# Altium footprint library Napelem_Inverter.PcbLib: 127 footprints (part 1 of 8)
Each footprint in its own frame and in the unit in brackets; x right, y up, seen from the top. Pads: shape width x height; smd on the part's side, far side on the other; paste and mask are expansions set on the pad; w line width, h text height; cw(c..) or ccw(c..) is an arc to the next point about the centre after c.
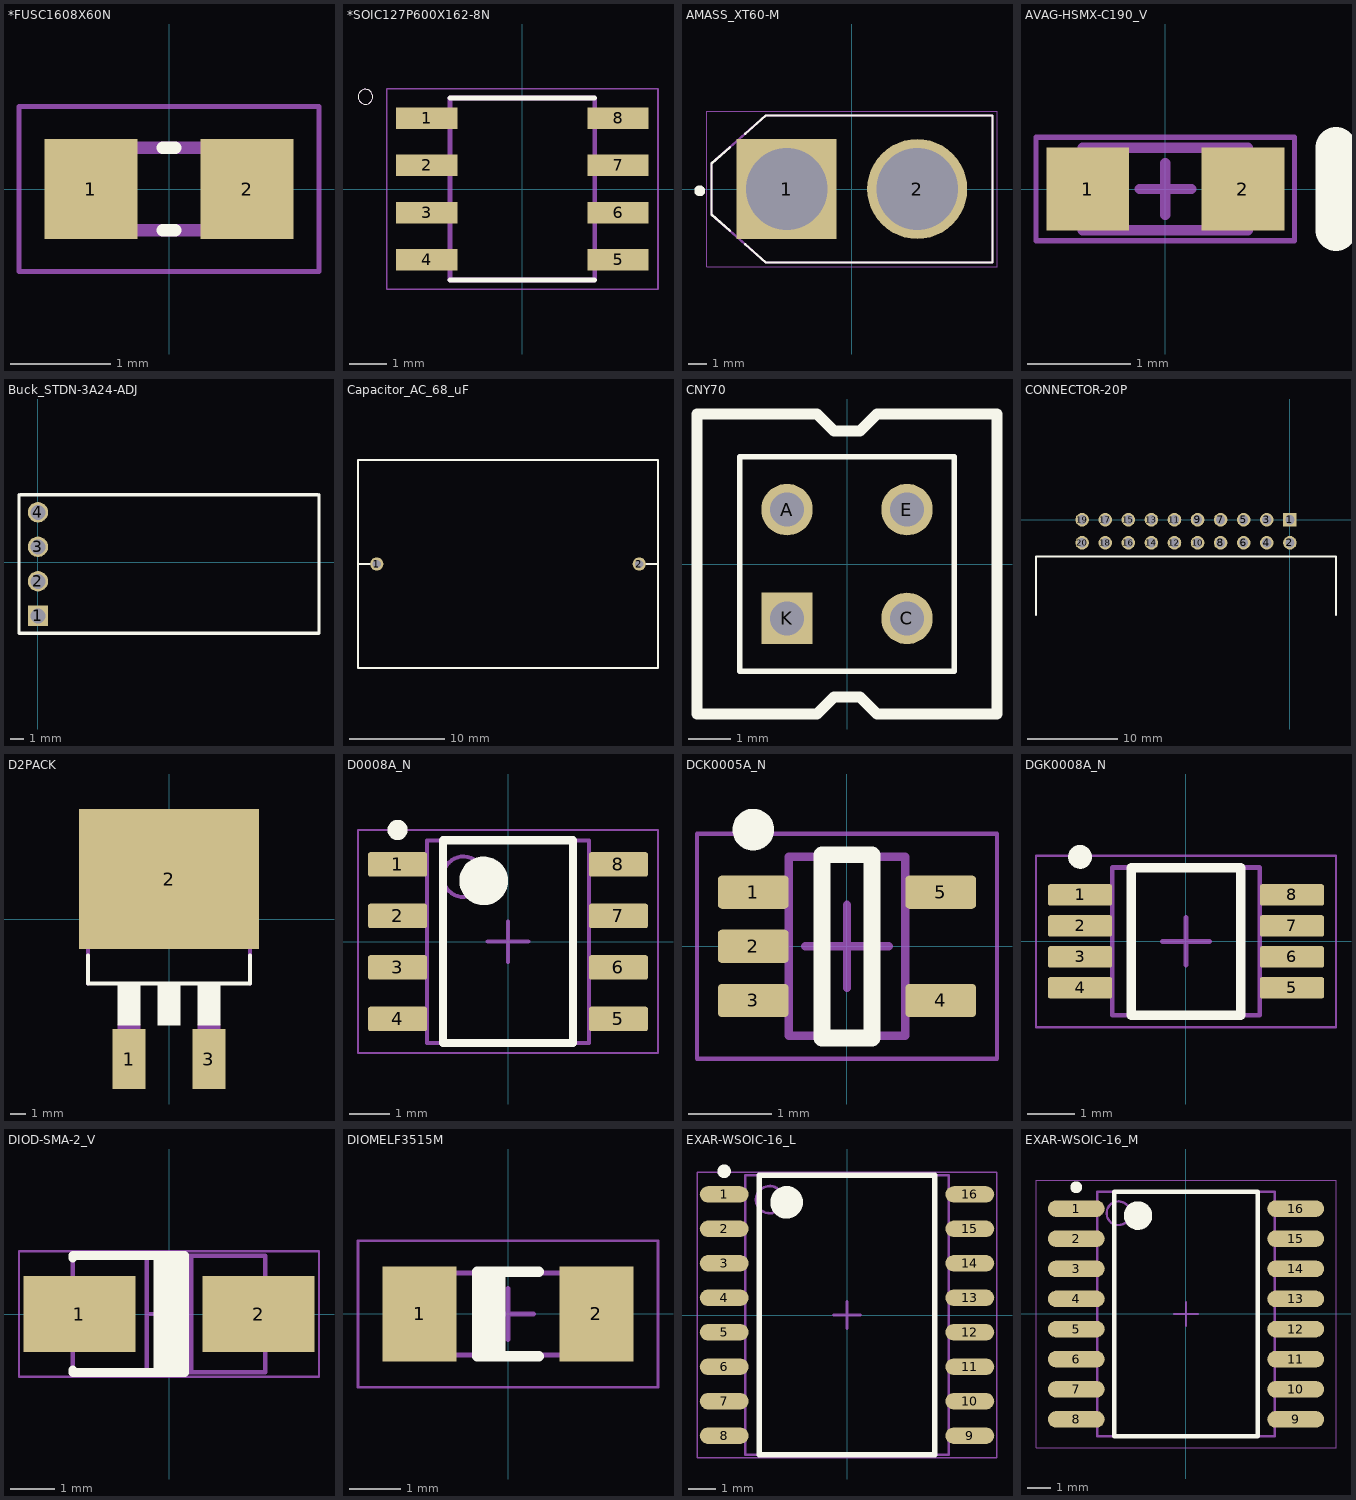
[diagram p0: the footprints below, top view; thin cyan lines are the x and y axes]

## *FUSC1608X60N [mm]
pads (2):
  rect 0.92x0.99 smd: 1(-0.775,0) 2(0.775,0)
Top Overlay:
  lines w0.127: -0.06,-0.41 0.06,-0.41 ; -0.06,0.41 0.06,0.41
Mechanical 4:
  lines w0.127: -0.8,-0.41 0.8,-0.41 ; -0.8,-0.41 -0.8,0.41 ; -0.8,-0.41 0.8,-0.41 ; -0.8,-0.41 -0.8,0.41 ; -0.8,0.41 0.8,0.41 ; -0.8,0.41 0.8,0.41 ; 0.8,-0.41 0.8,0.41 ; 0.8,-0.41 0.8,0.41
Mechanical 15:
  lines w0.05: -1.49,-0.82 -1.49,0.82 1.49,0.82 1.49,-0.82 -1.49,-0.82

## *SOIC127P600X162-8N [mm]
pads (8):
  rect 1.65x0.58 smd: 1(-2.58,1.905) 2(-2.58,0.635) 3(-2.58,-0.635) 4(-2.58,-1.905) 5(2.58,-1.905) 6(2.58,-0.635) 7(2.58,0.635) 8(2.58,1.905)
Top Overlay:
  circle w0: c-4.23,2.485 r0.2
  lines w0.127: -1.95,-2.45 1.95,-2.45 ; -1.95,2.45 1.95,2.45
Mechanical 4:
  circle w0: c-4.23,2.485 r0.2
  circle w0: c-4.23,2.485 r0.2
  lines w0.127: -1.95,-2.45 1.95,-2.45 ; -1.95,-2.45 -1.95,2.45 ; -1.95,-2.45 1.95,-2.45 ; -1.95,-2.45 -1.95,2.45 ; -1.95,2.45 1.95,2.45 ; -1.95,2.45 1.95,2.45 ; 1.95,-2.45 1.95,2.45 ; 1.95,-2.45 1.95,2.45
Mechanical 16:
  lines w0.05: -3.655,-2.7 3.655,-2.7 3.655,2.7 -3.655,2.7 -3.655,-2.7

## AMASS_XT60-M [mm]
pads (2):
  rect 5.516x5.516 hole 4.5: 1(-3.6,0)
  round 5.516 hole 4.5: 2(3.6,0)
Top Overlay:
  circle w0.3: c-8.4,-0.1 r0.15
  lines w0.127: -6.73,-2.3 -7.75,-1.4 -7.75,1.4 -6.73,2.3 ; -5.88,-3.05 -4.75,-4.05 7.75,-4.05 7.75,4.05 -4.75,4.05 -5.88,3.05
Mechanical 13:
  lines w0.127: -7.75,-1.4 -4.75,-4.05 7.75,-4.05 7.75,4.05 -4.75,4.05 -7.75,1.4 -7.75,-1.4
Mechanical 15:
  lines w0.05: -8,-4.3 8,-4.3 8,4.3 -8,4.3 -8,-4.3

## AVAG-HSMX-C190_V [mm] "SMD, 2-Leads, Body 1.6x0.8mm, Height 0.9mm"
height 0.9
pads (2):
  rect 0.8x0.8 smd: 1(-0.75,0) 2(0.75,0)
Top Overlay:
  lines w0.4: 1.65,-0.4 1.65,0.4
Mechanical 13:
  lines w0.1: -0.8,-0.4 -0.8,0.4 0.8,0.4 0.8,-0.4 -0.8,-0.4
Mechanical 15:
  lines w0.05: -1.25,-0.5 1.25,-0.5 1.25,0.5 -1.25,0.5 -1.25,-0.5
  lines w0.1: -0.25,0 0.25,0 ; 0,-0.25 0,0.25
3D body: height 0.9, standoff 0.4, extent -0.55,-0.4 0.55,0.4
3D body: height 0.4, standoff 0, extent -0.8,-0.4 0.8,0.4

## Buck_STDN-3A24-ADJ [mm]
pads (4):
  rect 1.5x1.5 hole 1.1: 1(0,-3.937)
  round 1.5 hole 1.1: 2(0,-1.397) 3(0,1.143) 4(0,3.683)
Top Overlay:
  lines w0.254: -1.397,4.963 -1.397,-5.207 20.701,-5.207 20.701,4.963 ; -1.27,4.963 20.574,4.963
3D body: height 2.54, standoff 0, extent -1.27,-5.207 1.27,-0.127
3D body: height 0, standoff -3, extent -0.33,-4.267 0.33,-3.607
3D body: height 0, standoff -3, extent -0.33,-1.727 0.33,-1.067
3D body: height 8.54, standoff 2.54, extent -0.33,-1.727 0.33,-1.067
3D body: height 8.54, standoff 2.54, extent -0.33,-4.267 0.33,-3.607
3D body: height 8.54, standoff 2.54, extent -0.33,0.813 0.33,1.473
3D body: height 8.54, standoff 2.54, extent -0.33,3.353 0.33,4.013
3D body: height 0, standoff -3, extent -0.33,3.353 0.33,4.013
3D body: height 0, standoff -3, extent -0.33,0.813 0.33,1.473
3D body: height 2.54, standoff 0, extent -1.27,-0.127 1.27,4.953

## Capacitor_AC_68_uF [mil]
pads (2):
  round 55 hole 35: 1(-120503.27,-120503.27) 2(-119418.27,-120503.27)
Top Overlay:
  lines w10: -120505.77,-120503.27 -120580.77,-120503.27 ; -119418.27,-120503.27 -119343.27,-120503.27 ; -120580.77,-120503.27 -120580.77,-120933.27 -119340.77,-120933.27 -119340.77,-120073.27 -120580.77,-120073.27 -120580.77,-120348.27 -120580.77,-120503.27

## CNY70 [mm]
height 6
pads (4):
  round 1.2 hole 0.8: A(-1.4,1.27) C(1.4,-1.27) E(1.4,1.27)
  rect 1.2x1.2 hole 0.8: K(-1.4,-1.27)
Top Overlay:
  lines w0.127: -2.5,-2.5 2.5,-2.5 2.5,2.5 -2.5,2.5 -2.5,-2.5
  lines w0.254: -3.5,-3.5 -3.5,3.5 -0.7,3.5 -0.3,3.1 0.3,3.1 0.7,3.5 3.5,3.5 3.5,-3.5 0.7,-3.5 0.3,-3.1 -0.3,-3.1 -0.7,-3.5 -3.5,-3.5
3D body "SW3dPS-cny70-1.STEP": height 6.02, standoff -5.73, extent -3.5,-3.5 3.5,3.5

## CONNECTOR-20P [mm] "Right angle ribbon cable connector"
height 8.95
pads (20):
  rect 1.5x1.5 hole 1: 1(0,0)
  round 1.5 hole 1: 2(0,-2.54) 3(-2.54,0) 4(-2.54,-2.54) 5(-5.08,0) 6(-5.08,-2.54) 7(-7.62,0) 8(-7.62,-2.54) 9(-10.16,0) 10(-10.16,-2.54) 11(-12.7,0) 12(-12.7,-2.54) 13(-15.24,0) 14(-15.24,-2.54) 15(-17.78,0) 16(-17.78,-2.54) 17(-20.32,0) 18(-20.32,-2.54) 19(-22.86,0) 20(-22.86,-2.54)
Top Overlay:
  lines w0.2: -27.94,-10.5 -27.94,-4.064 5.08,-4.064 5.08,-10.5
3D body: height 8.95, standoff 0, extent -28.04,-13.3 5.18,-3.964

## D2PACK [mil]
pads (3):
  rect 82x150 smd: 1(-100,-350) 3(100,-350)
  rect 450x350 smd: 2(0,100)
Top Overlay:
  region: 28,-265.07 -28.01,-265.07 -28.01,-167 28,-167
  region: 128,-265.46 72.13,-265.46 72.13,-167 128,-167
  region: -72,-265.3 -128.15,-265.3 -128.15,-167 -72,-167
  lines w10: -202,-91 -202,-161 202,-161 202,-91
Mechanical 13:
  region: 128,-321.2 72.05,-321.2 72.05,-265 128,-265
  region: 122,-375.31 78.06,-375.31 78.06,-319 122,-319
  region: -72,-321.49 -128.2,-321.49 -128.2,-265 -72,-265
  region: -78,-375.61 -122.2,-375.61 -122.2,-319 -78,-319
  lines w10: -202,-161 -202,175 ; 202,-161 202,175 ; -202,175 202,175 ; -202,175 -202,185 -133,229 123,229 202,175

## D0008A_N [mm] "SOIC, 8-Leads, Body 5x4mm, Pitch 1.27mm, IPC Medium Density"
height 1.75
pads (8):
  rrect17% 1.45x0.6 smd: 1(-2.725,1.905) 2(-2.725,0.635) 3(-2.725,-0.635) 4(-2.725,-1.905) 5(2.725,-1.905) 6(2.725,-0.635) 7(2.725,0.635) 8(2.725,1.905)
Top Overlay:
  circle w0.25: c-2.725,2.755 r0.125
  circle w0.6: c-0.6,1.5 r0.3
  lines w0.2: -1.6,-2.5 -1.6,2.5 1.6,2.5 1.6,-2.5 -1.6,-2.5
Mechanical 1:
  text ".Designator" at -1.397,-0.254 h0.6
Mechanical 13:
  circle w0.1: c-1.1,1.6 r0.5
  lines w0.1: -2,-2.5 -2,2.5 2,2.5 2,-2.5 -2,-2.5
Mechanical 15:
  lines w0.05: -3.7,-2.75 -3.7,2.75 3.7,2.75 3.7,-2.75 -3.7,-2.75
  lines w0.1: -0.5,0 0.5,0 ; 0,-0.5 0,0.5
3D body "SOIC-8akaD0008AakaM08A.stp": height 1.63, standoff 0, extent -3,-2.45 3,2.45

## DCK0005A_N [mm] "SOT23, 5-Leads, Body 2.15x1.4mm, Pitch 0.65mm, IPC Medium Density"
height 1.1
pads (5):
  rrect25% 0.85x0.4 smd: 1(-1.125,0.65) 2(-1.125,0) 3(-1.125,-0.65) 4(1.125,-0.65) 5(1.125,0.65)
Top Overlay:
  circle w0.25: c-1.125,1.4 r0.125
  lines w0.2: -0.3,-1.1 0.3,-1.1 0.3,1.1 -0.3,1.1 -0.3,-1.1
Mechanical 1:
  text ".Designator" at -0.635,-0.127 h0.3
Mechanical 13:
  lines w0.1: -0.7,-1.075 -0.7,1.075 0.7,1.075 0.7,-1.075 -0.7,-1.075
Mechanical 15:
  lines w0.05: -1.8,-1.35 -1.8,1.35 1.8,1.35 1.8,-1.35 -1.8,-1.35
  lines w0.1: -0.5,0 0.5,0 ; 0,-0.5 0,0.5
3D body "DCK0005AakaMAA05A.stp": height 0.94, standoff -0.01, extent -1.14,-1 1.14,1

## DGK0008A_N [mm] "TSOP, 8-Leads, Body 3.1x3.1mm, Pitch 0.65mm, IPC Medium Density"
height 1.1
pads (8):
  rrect22% 1.35x0.45 smd: 1(-2.225,0.975) 2(-2.225,0.325) 3(-2.225,-0.325) 4(-2.225,-0.975) 5(2.225,-0.975) 6(2.225,-0.325) 7(2.225,0.325) 8(2.225,0.975)
Top Overlay:
  circle w0.25: c-2.225,1.775 r0.125
  lines w0.2: -1.15,-1.55 -1.15,1.55 1.15,1.55 1.15,-1.55 -1.15,-1.55
Mechanical 1:
  text ".Designator" at -1.397,-0.254 h0.7
Mechanical 13:
  lines w0.1: -1.55,-1.55 -1.55,1.55 1.55,1.55 1.55,-1.55 -1.55,-1.55
Mechanical 15:
  lines w0.05: -3.15,-1.8 -3.15,1.8 3.15,1.8 3.15,-1.8 -3.15,-1.8
  lines w0.1: -0.5,0 0.5,0 ; 0,-0.5 0,0.5
3D body "MUY08A_ASM.stp": height 0.94, standoff -0.02, extent -2.451,-1.499 2.451,1.499

## DIOD-SMA-2_V [mm] "SMA, 2-Leads, Body 4.3x2.605mm, Height 2.3mm"
height 2.3
pads (2):
  rect 2.5x1.7 smd: 1(-2,0) 2(2,0)
Top Overlay:
  rectangle: -0.35,-1.27 0.35,1.335
  lines w0.2: -2.15,-1.302 0.35,-1.302 0.35,1.302 -2.15,1.302 ; -2.15,-1.302 -2.15,-1.25 ; -2.15,1.25 -2.15,1.302
Mechanical 13:
  lines w0.1: -0.5,-1.302 -0.5,1.302 ; 0.5,-1.302 0.5,1.302 ; -2.15,-1.302 -2.15,1.302 2.15,1.302 2.15,-1.302 -2.15,-1.302
Mechanical 15:
  lines w0.05: -3.35,-1.402 -3.35,1.402 3.35,1.402 3.35,-1.402 -3.35,-1.402
  lines w0.1: -0.5,0 0.5,0 ; 0,-0.5 0,0.5
3D body: height 2.3, standoff 0.05, extent -0.5,-1.302 0.5,1.302
3D body: height 2.3, standoff 0.4, extent -2.15,-1.302 -0.5,1.302
3D body: height 2.3, standoff 0.4, extent 0.5,-1.302 2.15,1.302

## DIOMELF3515M [mm] "MELF Diode, 2-Leads, Body 3,50x1,50mm, IPC Low Density"
height 1.6
pads (2):
  rect 1.45x1.85 smd: 1(-1.725,0) 2(1.725,0)
Top Overlay:
  rectangle: -0.6,-0.825 -0.05,0.825
  lines w0.2: 0.6,-0.825 -0.6,-0.825 -0.6,0.825 0.6,0.825
Mechanical 13:
  lines w0.1: -1.8,-0.8 1.8,-0.8 1.8,0.8 -1.8,0.8 -1.8,-0.8
Mechanical 15:
  lines w0.05: -2.925,-1.425 2.925,-1.425 2.925,1.425 -2.925,1.425 -2.925,-1.425
  lines w0.1: -0.5,0 0.5,0 ; 0,-0.5 0,0.5
3D body "DIOMELF3515M.step": height 1.5, standoff 0.01, extent -1.75,-0.749 1.75,0.749

## EXAR-WSOIC-16_L [mm] "SOIC, 16-Leads, Body 10.30x7.50mm, Pitch 1.27mm, IPC High Density"
height 2.65
pads (16):
  oval 1.8x0.6 smd: 1(-4.525,4.445) 2(-4.525,3.175) 3(-4.525,1.905) 4(-4.525,0.635) 5(-4.525,-0.635) 6(-4.525,-1.905) 7(-4.525,-3.175) 8(-4.525,-4.445) 9(4.525,-4.445) 10(4.525,-3.175) 11(4.525,-1.905) 12(4.525,-0.635) 13(4.525,0.635) 14(4.525,1.905) 15(4.525,3.175) 16(4.525,4.445)
Top Overlay:
  circle w0.6: c-2.225,4.15 r0.3
  circle w0.25: c-4.525,5.295 r0.125
  lines w0.2: -3.225,-5.15 3.225,-5.15 3.225,5.15 -3.225,5.15 -3.225,-5.15
Mechanical 13:
  circle w0.1: c-2.85,4.25 r0.5
  lines w0.1: -3.75,-5.15 3.75,-5.15 3.75,5.15 -3.75,5.15 -3.75,-5.15
Mechanical 15:
  lines w0.05: -5.525,-5.25 5.525,-5.25 5.525,5.25 -5.525,5.25 -5.525,-5.25
  lines w0.1: -0.5,0 0.5,0 ; 0,-0.5 0,0.5
3D body: height 2.65, standoff 0.1, extent -3.75,-5.15 3.75,5.15

## EXAR-WSOIC-16_M [mm] "SOIC, 16-Leads, Body 10.30x7.50mm, Pitch 1.27mm, IPC Low Density"
height 2.65
pads (16):
  oval 2.4x0.7 smd: 1(-4.625,4.445) 2(-4.625,3.175) 3(-4.625,1.905) 4(-4.625,0.635) 5(-4.625,-0.635) 6(-4.625,-1.905) 7(-4.625,-3.175) 8(-4.625,-4.445) 9(4.625,-4.445) 10(4.625,-3.175) 11(4.625,-1.905) 12(4.625,-0.635) 13(4.625,0.635) 14(4.625,1.905) 15(4.625,3.175) 16(4.625,4.445)
Top Overlay:
  circle w0.25: c-4.625,5.345 r0.125
  circle w0.6: c-2.025,4.15 r0.3
  lines w0.2: -3.025,-5.15 -3.025,5.15 3.025,5.15 3.025,-5.15 -3.025,-5.15
Mechanical 13:
  circle w0.1: c-2.85,4.25 r0.5
  lines w0.1: -3.75,-5.15 -3.75,5.15 3.75,5.15 3.75,-5.15 -3.75,-5.15
Mechanical 15:
  lines w0.05: -6.325,-5.65 -6.325,5.65 6.325,5.65 6.325,-5.65 -6.325,-5.65
  lines w0.1: -0.5,0 0.5,0 ; 0,-0.5 0,0.5
3D body: height 2.65, standoff 0.1, extent -3.75,-5.15 3.75,5.15